# Altium footprint library ICs And Semiconductors SMD.PcbLib: 943 footprints (part 20 of 60)
Each footprint in its own frame and in the unit in brackets; x right, y up, seen from the top. Pads: shape width x height; smd on the part's side, far side on the other; paste and mask are expansions set on the pad; w line width, h text height; cw(c..) or ccw(c..) is an arc to the next point about the centre after c.
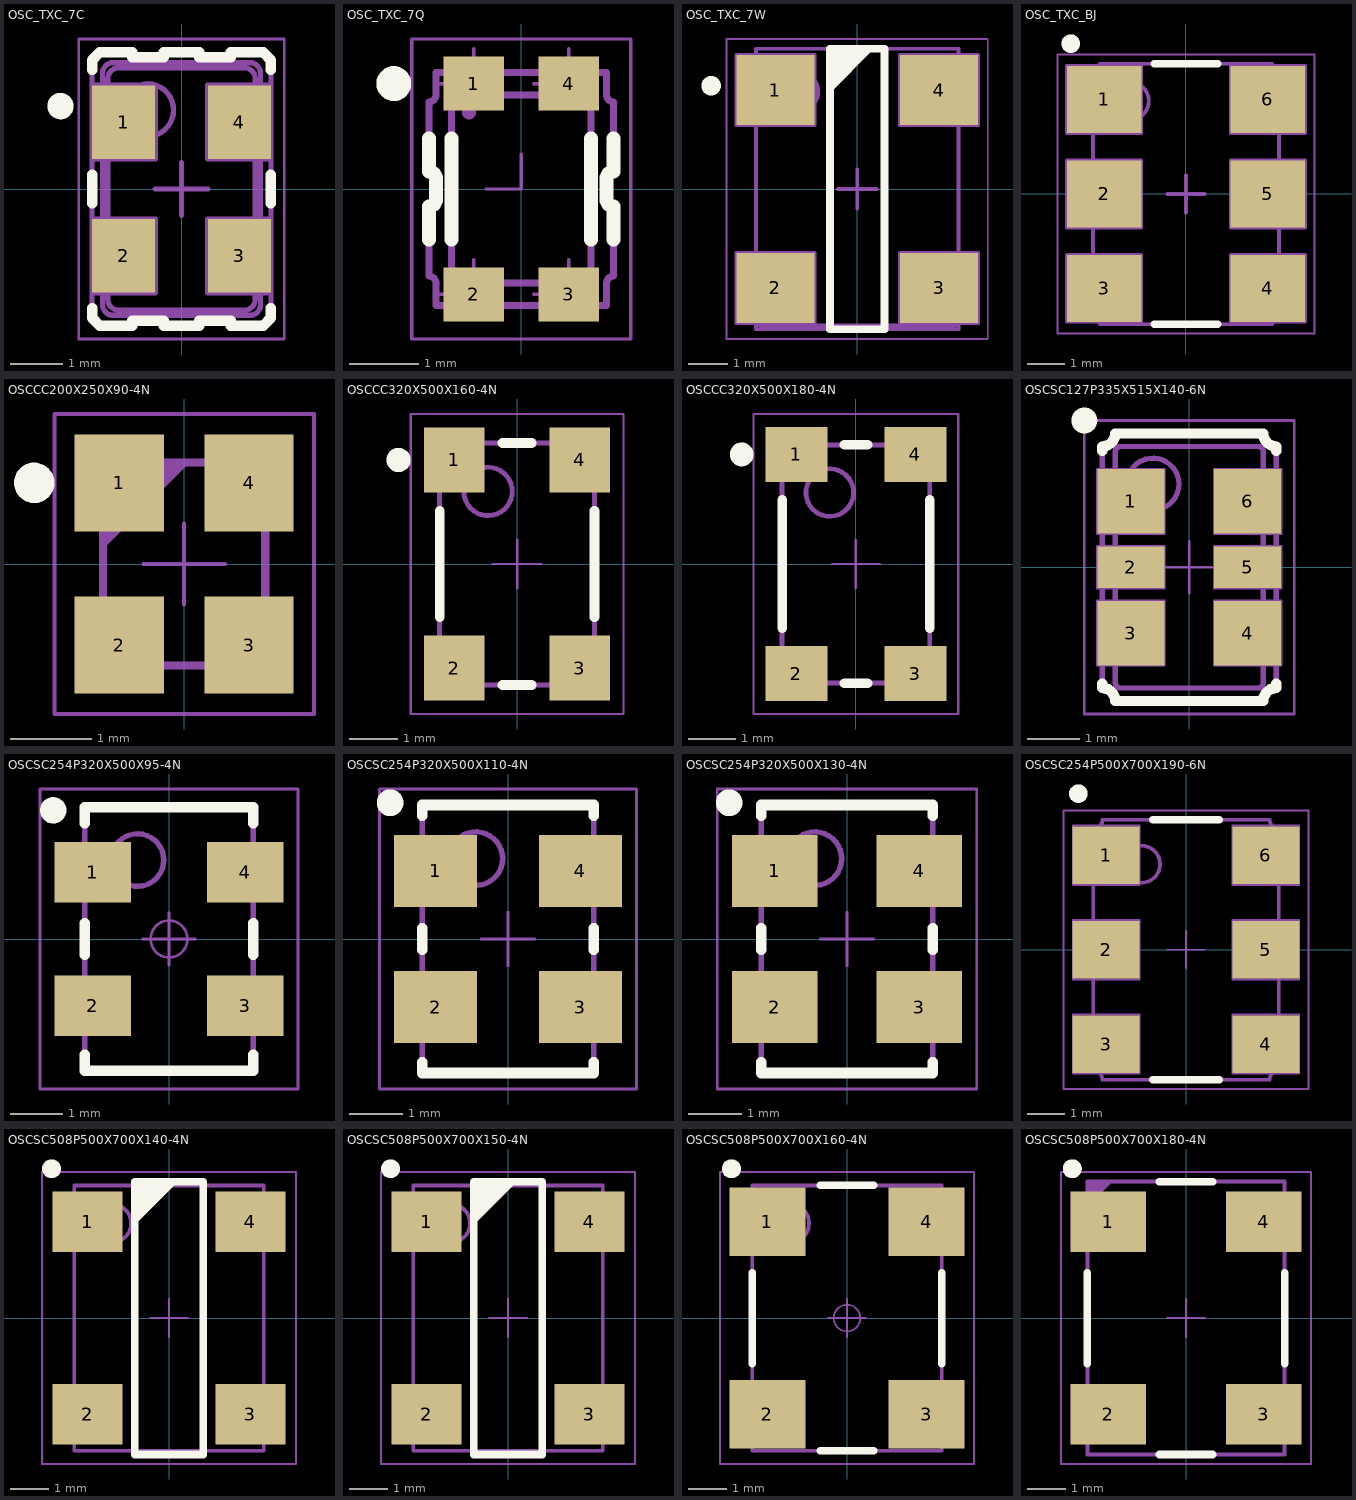
[diagram p19: the footprints below, top view; thin cyan lines are the x and y axes]

## OSC_TXC_7C [mm] "SMD Oscillator, 4 pins, 5 x 3.2mm, 7C Serie"
height 1.4
pads (4):
  rect 1.2x1.4 smd: 1(-1.1,1.27) 2(-1.1,-1.27) 3(1.1,-1.27) 4(1.1,1.27)
Top Overlay:
  circle w0.25: c-2.3,1.575 r0.125
  lines w0.2: -1.7,-2.27 -1.7,-2.45 -1.55,-2.6 -0.935,-2.6 -0.935,-2.5 -0.335,-2.5 -0.335,-2.6 ; -1.7,-0.27 -1.7,0.27 ; -1.7,2.27 -1.7,2.45 -1.55,2.6 -0.935,2.6 -0.935,2.5 -0.335,2.5 -0.335,2.6 0.335,2.6 0.335,2.5 0.935,2.5 0.935,2.6 1.55,2.6 1.7,2.45 1.7,2.27 ; 1.7,-2.27 1.7,-2.45 1.55,-2.6 0.935,-2.6 0.935,-2.5 0.335,-2.5 0.335,-2.6 ; 1.7,-0.27 1.7,0.27 ; -0.335,-2.6 0.335,-2.6 ; -0.335,-2.6 0.335,-2.6
Mechanical 8:
  lines w0.1: -1.6,-1.27 -1.1,-1.27 ; -1.6,1.27 -1.1,1.27 ; -1.1,-1.77 -1.1,-1.27 ; -1.1,-0.77 -1.1,-1.27 ; -1.1,0.77 -1.1,1.27 ; -1.1,1.77 -1.1,1.27 ; -0.6,-1.27 -1.1,-1.27 ; -0.6,1.27 -1.1,1.27 ; -0.5,0 0,0 ; 0,-0.5 0,0 ; 0,0.5 0,0 ; 0.5,0 0,0 ; 0.6,-1.27 1.1,-1.27 ; 0.6,1.27 1.1,1.27 ; 1.1,-1.77 1.1,-1.27 ; 1.1,-0.77 1.1,-1.27 ; 1.1,0.77 1.1,1.27 ; 1.1,1.77 1.1,1.27 ; 1.6,-1.27 1.1,-1.27 ; 1.6,1.27 1.1,1.27 ; -1.7,-1.97 -0.5,-1.97 -0.5,-0.57 -1.7,-0.57 -1.7,-1.97 ; -1.7,0.57 -0.5,0.57 -0.5,1.97 -1.7,1.97 -1.7,0.57 ; 0.5,-1.97 0.5,-0.57 1.7,-0.57 1.7,-1.97 0.5,-1.97 ; 0.5,0.57 1.7,0.57 1.7,1.97 0.5,1.97 0.5,0.57
Mechanical 14:
  circle w0.1: c-0.65,1.5 r0.5
  lines w0.1: -0.335,-2.6 0.335,-2.6 ; -0.335,-2.6 -0.335,-2.5 -0.935,-2.5 -0.935,-2.6 -1.55,-2.6 -1.7,-2.45 -1.7,-1.97 -1.6,-1.87 -1.6,-0.67 -1.7,-0.57 -1.7,0.57 -1.6,0.67 -1.6,1.87 -1.7,1.97 -1.7,2.45 -1.55,2.6 -0.935,2.6 -0.935,2.5 -0.335,2.5 -0.335,2.6 0.335,2.6 0.335,2.5 0.935,2.5 0.935,2.6 1.55,2.6 1.7,2.45 1.7,1.97 1.6,1.87 1.6,0.67 1.7,0.57 1.7,-0.57 1.6,-0.67 1.6,-1.87 1.7,-1.97 1.7,-2.45 1.55,-2.6 0.935,-2.6 0.935,-2.5 0.335,-2.5 0.335,-2.6 ; -0.335,-2.6 0.335,-2.6 ; -1.5,-2.2 ccw(c-1.3,-2.2) -1.3,-2.4 1.3,-2.4 ccw(c1.3,-2.2) 1.5,-2.2 1.5,2.2 ccw(c1.3,2.2) 1.3,2.4 -1.3,2.4 ccw(c-1.3,2.2) -1.5,2.2 -1.5,-2.2 ; -1.4,-2.1 ccw(c-1.2,-2.1) -1.2,-2.3 1.2,-2.3 ccw(c1.2,-2.1) 1.4,-2.1 1.4,2.1 ccw(c1.2,2.1) 1.2,2.3 -1.2,2.3 ccw(c-1.2,2.1) -1.4,2.1 -1.4,-2.1
Mechanical 15:
  lines w0.05: -1.95,-2.85 1.95,-2.85 1.95,2.85 -1.95,2.85 -1.95,-2.85
3D body "OSC_TXC_7C.stp": height 1.4, standoff 0, extent -1.7,-2.6 1.7,2.6

## OSC_TXC_7Q [mm] "SMD Oscillator, 4 pins, 3.2 x 2.5mm, 7Q Series"
height 1.1
pads (4):
  rect 0.87x0.78 smd: 1(-0.68,1.515) 2(-0.68,-1.515) 3(0.68,-1.515) 4(0.68,1.515)
Top Overlay:
  circle w0.25: c-1.83,1.515 r0.125
  lines w0.2: -1.325,-0.725 -1.325,-0.25 ccw(c-1.325,-0.15) -1.225,-0.15 -1.225,0.15 ccw(c-1.325,0.15) -1.325,0.25 -1.325,0.725 ; -1,-0.725 -1,0.725 ; 1,-0.725 1,0.725 ; 1.325,-0.725 1.325,-0.25 cw(c1.325,-0.15) 1.225,-0.15 1.225,0.15 cw(c1.325,0.15) 1.325,0.25 1.325,0.725
Mechanical 8:
  lines w0.05: -1.18,-1.515 -0.68,-1.515 -0.68,-1.015 ; -1.18,1.515 -0.68,1.515 -0.68,2.015 ; -0.5,0 0,0 0,0.5 ; 0.18,-1.515 0.68,-1.515 0.68,-1.015 ; 0.18,1.515 0.68,1.515 0.68,2.015
Mechanical 14:
  circle w0.1: c-0.75,1.1 r0.05
  lines w0.1: -1.325,-1.25 cw(c-1.325,-1.35) -1.225,-1.35 -1.225,-1.675 -0.77,-1.675 cw(c-0.67,-1.675) -0.67,-1.575 -0.6,-1.575 cw(c-0.6,-1.675) -0.5,-1.675 0.5,-1.675 cw(c0.6,-1.675) 0.6,-1.575 0.67,-1.575 cw(c0.67,-1.675) 0.77,-1.675 1.225,-1.675 1.225,-1.35 cw(c1.325,-1.35) 1.325,-1.25 1.325,-0.25 cw(c1.325,-0.15) 1.225,-0.15 1.225,0.15 cw(c1.325,0.15) 1.325,0.25 1.325,1.25 cw(c1.325,1.35) 1.225,1.35 1.225,1.675 0.77,1.675 cw(c0.67,1.675) 0.67,1.575 0.6,1.575 cw(c0.6,1.675) 0.5,1.675 -0.5,1.675 cw(c-0.6,1.675) -0.6,1.575 -0.67,1.575 cw(c-0.67,1.675) -0.77,1.675 -1.225,1.675 -1.225,1.35 cw(c-1.325,1.35) -1.325,1.25 -1.325,0.25 cw(c-1.325,0.15) -1.225,0.15 -1.225,-0.15 cw(c-1.325,-0.15) -1.325,-0.25 -1.325,-1.25 ; -1,-1.1 ccw(c-0.75,-1.1) -0.75,-1.35 0.75,-1.35 ccw(c0.75,-1.1) 1,-1.1 1,1.1 ccw(c0.75,1.1) 0.75,1.35 -0.75,1.35 ccw(c-0.75,1.1) -1,1.1 -1,-1.1
Mechanical 15:
  lines w0.05: -1.575,-2.155 1.575,-2.155 1.575,2.155 -1.575,2.155 -1.575,-2.155
3D body "OSC_TXC_7Q.stp": height 1.1, standoff 0, extent -1.325,-1.675 1.325,1.675

## OSC_TXC_7W [mm] "SMD Oscillator, Side Convave, 4 pins, 5.00x7.00mm 7W Series"
height 1.5
pads (4):
  rect 2x1.8 smd: 1(-2.1,2.54) 2(-2.1,-2.54) 3(2.1,-2.54) 4(2.1,2.54)
Top Overlay:
  circle w0.25: c-3.75,2.65 r0.125
  lines w0.2: -0.7,2.6 0.3,3.6 ; -0.7,2.8 0.1,3.6 ; -0.7,3 -0.1,3.6 ; -0.7,3.2 -0.3,3.6 ; -0.7,3.4 -0.5,3.6 ; -0.7,-3.6 0.7,-3.6 0.7,3.6 -0.7,3.6 -0.7,-3.6
Mechanical 8:
  lines w0.1: -2.6,-2.54 -2.1,-2.54 ; -2.6,2.54 -2.1,2.54 ; -2.1,-3.04 -2.1,-2.54 ; -2.1,-2.04 -2.1,-2.54 ; -2.1,2.04 -2.1,2.54 ; -2.1,3.04 -2.1,2.54 ; -1.6,-2.54 -2.1,-2.54 ; -1.6,2.54 -2.1,2.54 ; -0.5,0 0,0 ; 0,-0.5 0,0 ; 0,0.5 0,0 ; 0.5,0 0,0 ; 1.6,-2.54 2.1,-2.54 ; 1.6,2.54 2.1,2.54 ; 2.1,-3.04 2.1,-2.54 ; 2.1,-2.04 2.1,-2.54 ; 2.1,2.04 2.1,2.54 ; 2.1,3.04 2.1,2.54 ; 2.6,-2.54 2.1,-2.54 ; 2.6,2.54 2.1,2.54 ; -3.1,-3.44 -1.1,-3.44 -1.1,-1.64 -3.1,-1.64 -3.1,-3.44 ; -3.1,1.64 -1.1,1.64 -1.1,3.44 -3.1,3.44 -3.1,1.64 ; 1.1,-3.44 3.1,-3.44 3.1,-1.64 1.1,-1.64 1.1,-3.44 ; 1.1,1.64 3.1,1.64 3.1,3.44 1.1,3.44 1.1,1.64
Mechanical 14:
  circle w0.1: c-1.5,2.5 r0.5
  lines w0.1: -2.5,-3.5 2.5,-3.5 ; -2.6,-3.6 -2.6,3.6 2.6,3.6 2.6,-3.6 -2.6,-3.6
Mechanical 15:
  lines w0.05: -3.35,-3.85 3.35,-3.85 3.35,3.85 -3.35,3.85 -3.35,-3.85
3D body "OSC_TXC_7W.stp": height 1.42, standoff 0, extent -2.6,-3.6 2.6,3.6

## OSC_TXC_BJ [mm] "SMD Oscillator, Side Convave, 6 pins, 5.00x7.00mm BJ Series"
height 1.5
pads (6):
  rect 2x1.8 smd: 1(-2.2,2.54) 2(-2.2,0) 3(-2.2,-2.54) 4(2.2,-2.54) 5(2.2,0) 6(2.2,2.54)
Top Overlay:
  circle w0.25: c-3.1,4.04 r0.125
  lines w0.2: -0.85,-3.5 0.85,-3.5 ; -0.85,3.5 0.85,3.5
Mechanical 8:
  lines w0.1: -2.7,-2.54 -2.2,-2.54 ; -2.7,0 -2.2,0 ; -2.7,2.54 -2.2,2.54 ; -2.2,-3.04 -2.2,-2.54 ; -2.2,-2.04 -2.2,-2.54 ; -2.2,-0.5 -2.2,0 ; -2.2,0.5 -2.2,0 ; -2.2,2.04 -2.2,2.54 ; -2.2,3.04 -2.2,2.54 ; -1.7,-2.54 -2.2,-2.54 ; -1.7,0 -2.2,0 ; -1.7,2.54 -2.2,2.54 ; -0.5,0 0,0 ; 0,-0.5 0,0 ; 0,0.5 0,0 ; 0.5,0 0,0 ; 1.7,-2.54 2.2,-2.54 ; 1.7,0 2.2,0 ; 1.7,2.54 2.2,2.54 ; 2.2,-3.04 2.2,-2.54 ; 2.2,-2.04 2.2,-2.54 ; 2.2,-0.5 2.2,0 ; 2.2,0.5 2.2,0 ; 2.2,2.04 2.2,2.54 ; 2.2,3.04 2.2,2.54 ; 2.7,-2.54 2.2,-2.54 ; 2.7,0 2.2,0 ; 2.7,2.54 2.2,2.54 ; -3.2,-3.44 -1.2,-3.44 -1.2,-1.64 -3.2,-1.64 -3.2,-3.44 ; -3.2,-0.9 -1.2,-0.9 -1.2,0.9 -3.2,0.9 -3.2,-0.9 ; -3.2,1.64 -1.2,1.64 -1.2,3.44 -3.2,3.44 -3.2,1.64 ; 1.2,-3.44 3.2,-3.44 3.2,-1.64 1.2,-1.64 1.2,-3.44 ; 1.2,-0.9 3.2,-0.9 3.2,0.9 1.2,0.9 1.2,-0.9 ; 1.2,1.64 3.2,1.64 3.2,3.44 1.2,3.44 1.2,1.64
Mechanical 14:
  circle w0.1: c-1.5,2.5 r0.5
  lines w0.1: -2.5,-3.317 cw(c-2.6,-3.6) -2.317,-3.5 2.317,-3.5 cw(c2.6,-3.6) 2.5,-3.317 2.5,-3.04 cw(c2.499,-2.84) 2.299,-2.84 2.299,-2.24 cw(c2.499,-2.24) 2.5,-2.04 2.5,-0.5 cw(c2.499,-0.3) 2.299,-0.3 2.299,0.3 cw(c2.499,0.3) 2.5,0.5 2.5,2.04 cw(c2.499,2.24) 2.299,2.24 2.299,2.84 cw(c2.499,2.84) 2.5,3.04 2.5,3.317 cw(c2.6,3.6) 2.317,3.5 -2.317,3.5 cw(c-2.6,3.6) -2.5,3.317 -2.5,3.04 cw(c-2.499,2.84) -2.299,2.84 -2.299,2.24 cw(c-2.499,2.24) -2.5,2.04 -2.5,0.5 cw(c-2.499,0.3) -2.299,0.3 -2.299,-0.3 cw(c-2.499,-0.3) -2.5,-0.5 -2.5,-2.04 cw(c-2.499,-2.24) -2.299,-2.24 -2.299,-2.84 cw(c-2.499,-2.84) -2.5,-3.04 -2.5,-3.317
Mechanical 15:
  lines w0.05: -3.45,-3.75 3.45,-3.75 3.45,3.75 -3.45,3.75 -3.45,-3.75
3D body "OSC_TXC_BJ.stp": height 1.6, standoff 0, extent -2.5,-3.5 2.5,3.5

## OSCCC200X250X90-4N [mm] "Oscillator, corner concave; 4 pin, 2.50mm L X 2.00mm W X 0.90mm H, IPC Medium Density"
height 0.9
pads (4):
  rect 1.1x1.2 smd: 1(-0.8,1) 2(-0.8,-1) 3(0.8,-1) 4(0.8,1)
Top Overlay:
  circle w0.25: c-1.85,1 r0.125
Mechanical 14:
  lines w0.1: -1,0.25 0,1.25 ; -1,0.35 -0.1,1.25 ; -1,0.45 -0.2,1.25 ; -1,0.55 -0.3,1.25 ; -1,0.65 -0.4,1.25 ; -1,0.75 -0.5,1.25 ; -1,0.85 -0.6,1.25 ; -1,0.95 -0.7,1.25 ; -1,1.05 -0.8,1.25 ; -1,1.15 -0.9,1.25 ; -1,-1.25 -1,1.25 1,1.25 1,-1.25 -1,-1.25
Mechanical 15:
  lines w0.05: -0.5,0 0.5,0 ; 0,-0.5 0,0.5 ; -1.6,-1.85 -1.6,1.85 1.6,1.85 1.6,-1.85 -1.6,-1.85
3D body "OSCCC200X250X90-4N.stp": height 0.8, standoff 0, extent -1.075,-1.325 1.075,1.325

## OSCCC320X500X160-4N [mm] "SMD Oscillator, Corner Convave, 4 pins, 5x3.2mm"
height 1.6
pads (4):
  rect 1.25x1.35 smd: 1(-1.3,2.15) 2(-1.3,-2.15) 3(1.3,-2.15) 4(1.3,2.15)
Top Overlay:
  circle w0.25: c-2.45,2.15 r0.125
  lines w0.2: -1.6,-1.1 -1.6,1.1 ; -0.3,-2.5 0.3,-2.5 ; -0.3,2.5 0.3,2.5 ; 1.6,-1.1 1.6,1.1
Mechanical 14:
  circle w0.1: c-0.6,1.5 r0.5
  lines w0.1: -1.6,-2.5 -1.6,2.5 1.6,2.5 1.6,-2.5 -1.6,-2.5
Mechanical 15:
  lines w0.05: -0.5,0 0.5,0 ; 0,-0.5 0,0.5 ; -2.2,-3.1 -2.2,3.1 2.2,3.1 2.2,-3.1 -2.2,-3.1
3D body "OSCCC320X500X160-4N.stp": height 1.6, standoff 0, extent -1.675,-2.575 1.675,2.575

## OSCCC320X500X180-4N [mm] "SMD Oscillator, Corner Convave, 4 pins, 5x3mm"
height 1.8
pads (4):
  rect 1.3x1.15 smd: 1(-1.25,2.3) 2(-1.25,-2.3) 3(1.25,-2.3) 4(1.25,2.3)
Top Overlay:
  circle w0.25: c-2.4,2.3 r0.125
  lines w0.2: -1.55,-1.35 -1.55,1.35 ; -0.25,-2.5 0.25,-2.5 ; -0.25,2.5 0.25,2.5 ; 1.55,-1.35 1.55,1.35
Mechanical 14:
  circle w0.1: c-0.55,1.5 r0.5
  lines w0.1: -1.55,-2.5 1.55,-2.5 1.55,2.5 -1.55,2.5 -1.55,-2.5
Mechanical 15:
  lines w0.05: -0.5,0 0.5,0 ; 0,-0.5 0,0.5 ; -2.15,-3.15 2.15,-3.15 2.15,3.15 -2.15,3.15 -2.15,-3.15
3D body "OSCCC320X500X180-4N.stp": height 1.8, standoff 0, extent -1.7,-2.6 1.7,2.6

## OSCSC127P335X515X140-6N [mm] "Oscillator,side concave; 1.27mm pitch; 6 pin,3.35mm L X 5.15mm W X 1.40mm H, IPC Medium Density"
height 1.4
pads (6):
  rect 1.29x1.24 smd: 1(-1.125,1.27) 3(-1.125,-1.27) 4(1.125,-1.27) 6(1.125,1.27)
  rect 1.29x0.8 smd: 2(-1.125,0) 5(1.125,0)
Top Overlay:
  circle w0.25: c-2.02,2.825 r0.125
  lines w0.2: -1.675,-2.24 -1.675,-2.325 cw(c-1.675,-2.575) -1.425,-2.575 1.425,-2.575 cw(c1.675,-2.575) 1.675,-2.325 1.675,-2.24 ; -1.675,2.24 -1.675,2.325 ccw(c-1.675,2.575) -1.425,2.575 1.425,2.575 ccw(c1.675,2.575) 1.675,2.325 1.675,2.24
Mechanical 8:
  lines w0.05: -0.5,0 0,0 ; 0,-0.5 0,0 ; 0,0.5 0,0 ; 0.5,0 0,0 ; -1.77,-1.89 -1.77,-0.65 ; -1.77,-1.89 -0.48,-1.89 -0.48,-0.65 -1.77,-0.65 ; -1.77,-1.89 -1.125,-1.27 -1.77,-0.65 ; -1.77,-0.4 -0.48,-0.4 -0.48,0.4 -1.77,0.4 ; -1.77,-0.4 -1.77,0.4 ; -1.77,-0.4 -1.125,0 -1.77,0.4 ; -1.77,0.65 -1.77,1.89 ; -1.77,0.65 -0.48,0.65 -0.48,1.89 -1.77,1.89 ; -1.77,0.65 -1.125,1.27 -1.77,1.89 ; 1.77,-1.89 0.48,-1.89 0.48,-0.65 1.77,-0.65 ; 1.77,-1.89 1.77,-0.65 ; 1.77,-1.89 1.125,-1.27 1.77,-0.65 ; 1.77,-0.4 0.48,-0.4 0.48,0.4 1.77,0.4 ; 1.77,-0.4 1.77,0.4 ; 1.77,-0.4 1.125,0 1.77,0.4 ; 1.77,0.65 0.48,0.65 0.48,1.89 1.77,1.89 ; 1.77,0.65 1.77,1.89 ; 1.77,0.65 1.125,1.27 1.77,1.89
Mechanical 14:
  circle w0.1: c-0.7,1.6 r0.5
  lines w0.1: -1.675,-2.325 cw(c-1.675,-2.575) -1.425,-2.575 1.425,-2.575 cw(c1.675,-2.575) 1.675,-2.325 1.675,-1.52 cw(c1.675,-1.27) 1.575,-1.499 1.575,-1.041 cw(c1.675,-1.27) 1.675,-1.02 1.675,-0.25 cw(c1.675,0) 1.575,-0.229 1.575,0.229 cw(c1.675,0) 1.675,0.25 1.675,1.02 cw(c1.675,1.27) 1.575,1.041 1.575,1.499 cw(c1.675,1.27) 1.675,1.52 1.675,2.325 cw(c1.675,2.575) 1.425,2.575 -1.425,2.575 cw(c-1.675,2.575) -1.675,2.325 -1.675,1.52 cw(c-1.675,1.27) -1.575,1.499 -1.575,1.041 cw(c-1.675,1.27) -1.675,1.02 -1.675,0.25 cw(c-1.675,0) -1.575,0.229 -1.575,-0.229 cw(c-1.675,0) -1.675,-0.25 -1.675,-1.02 cw(c-1.675,-1.27) -1.575,-1.041 -1.575,-1.499 cw(c-1.675,-1.27) -1.675,-1.52 -1.675,-2.325 ; -1.425,-2.225 ccw(c-1.325,-2.225) -1.325,-2.325 1.325,-2.325 ccw(c1.325,-2.225) 1.425,-2.225 1.425,2.225 ccw(c1.325,2.225) 1.325,2.325 -1.325,2.325 ccw(c-1.325,2.225) -1.425,2.225 -1.425,-2.225
Mechanical 15:
  lines w0.05: -0.5,0 0.5,0 ; 0,-0.5 0,0.5 ; -2.02,-2.825 2.02,-2.825 2.02,2.825 -2.02,2.825 -2.02,-2.825
3D body "OSCSC127P335X515X140-6N.stp": height 1.4, standoff 0, extent -1.675,-2.575 1.675,2.575

## OSCSC254P320X500X95-4N [mm] "Oscillator, side concave; 2.54mm pitch; 4 pin, 3.20mm L X 5.00mm W X 1.10mm H, IPC Medium Density"
height 0.95
pads (4):
  rect 1.45x1.15 smd: 1(-1.45,1.27) 2(-1.45,-1.27) 3(1.45,-1.27) 4(1.45,1.27)
Top Overlay:
  circle w0.25: c-2.2,2.445 r0.125
  lines w0.2: -1.6,-2.2 -1.6,-2.5 1.6,-2.5 1.6,-2.2 ; -1.6,-0.3 -1.6,0.3 ; -1.6,2.2 -1.6,2.5 1.6,2.5 1.6,2.2 ; 1.6,-0.3 1.6,0.3
Mechanical 14:
  circle w0.1: c-0.6,1.5 r0.5
  lines w0.1: -1.6,-2.5 1.6,-2.5 1.6,2.5 -1.6,2.5 -1.6,-2.5
Mechanical 15:
  circle w0.05: c0,0 r0.35
  lines w0.05: -0.5,0 0.5,0 ; 0,-0.5 0,0.5 ; -2.45,-2.85 2.45,-2.85 2.45,2.85 -2.45,2.85 -2.45,-2.85
3D body "OSCSC254P320X500X110-4N.stp": height 1, standoff 0, extent -1.7,-2.6 1.7,2.6

## OSCSC254P320X500X110-4N [mm] "Oscillator, side concave; 2.54mm pitch; 4 pin, 3.20mm L X 5.00mm W X 1.10mm H, IPC Medium Density"
height 1.1
pads (4):
  rect 1.55x1.35 smd: 1(-1.35,1.27) 2(-1.35,-1.27) 3(1.35,-1.27) 4(1.35,1.27)
Top Overlay:
  circle w0.25: c-2.2,2.545 r0.125
  lines w0.2: -1.6,-2.3 -1.6,-2.5 1.6,-2.5 1.6,-2.3 ; -1.6,-0.2 -1.6,0.2 ; -1.6,2.3 -1.6,2.5 1.6,2.5 1.6,2.3 ; 1.6,-0.2 1.6,0.2
Mechanical 14:
  circle w0.1: c-0.6,1.5 r0.5
  lines w0.1: -1.6,-2.5 -1.6,2.5 1.6,2.5 1.6,-2.5 -1.6,-2.5
Mechanical 15:
  lines w0.05: -0.5,0 0.5,0 ; 0,-0.5 0,0.5 ; -2.4,-2.8 -2.4,2.8 2.4,2.8 2.4,-2.8 -2.4,-2.8
3D body "OSCSC254P320X500X110-4N.stp": height 1, standoff 0, extent -1.7,-2.6 1.7,2.6

## OSCSC254P320X500X130-4N [mm] "Oscillator, Side Concave; 2.54mm Pitch; 4 pin, 3.20mm L X 5.00mm W X 1.30mm H, IPC Medium Density"
height 1.3
pads (4):
  rect 1.6x1.35 smd: 1(-1.35,1.27) 2(-1.35,-1.27) 3(1.35,-1.27) 4(1.35,1.27)
Top Overlay:
  circle w0.25: c-2.2,2.545 r0.125
  lines w0.2: -1.6,-2.3 -1.6,-2.5 1.6,-2.5 1.6,-2.3 ; -1.6,-0.2 -1.6,0.2 ; -1.6,2.3 -1.6,2.5 1.6,2.5 1.6,2.3 ; 1.6,-0.2 1.6,0.2
Mechanical 14:
  circle w0.1: c-0.6,1.5 r0.5
  lines w0.1: -1.6,-2.5 1.6,-2.5 1.6,2.5 -1.6,2.5 -1.6,-2.5
Mechanical 15:
  lines w0.05: -0.5,0 0.5,0 ; 0,-0.5 0,0.5 ; -2.425,-2.8 2.425,-2.8 2.425,2.8 -2.425,2.8 -2.425,-2.8
3D body "OSCSC254P320X500X130-4N.stp": height 1.3, standoff 0, extent -1.7,-2.6 1.7,2.6

## OSCSC254P500X700X190-6N [mm] "Oscillator, side concave; 2.54mm pitch; 6 pin, 5.00mm L X 7.00mm W X 1.90mm H, IPC Medium Density"
height 1.9
pads (6):
  rect 1.8x1.55 smd: 1(-2.15,2.54) 2(-2.15,0) 3(-2.15,-2.54) 4(2.15,-2.54) 5(2.15,0) 6(2.15,2.54)
Top Overlay:
  circle w0.25: c-2.9,4.2 r0.125
  lines w0.2: -0.9,-3.5 0.9,-3.5 ; -0.9,3.5 0.9,3.5
Mechanical 8:
  lines w0.05: -2.65,-2.54 -2.15,-2.54 ; -2.65,0 -2.15,0 ; -2.65,2.54 -2.15,2.54 ; -2.15,-3.04 -2.15,-2.54 ; -2.15,-2.04 -2.15,-2.54 ; -2.15,-0.5 -2.15,0 ; -2.15,0.5 -2.15,0 ; -2.15,2.04 -2.15,2.54 ; -2.15,3.04 -2.15,2.54 ; -1.65,-2.54 -2.15,-2.54 ; -1.65,0 -2.15,0 ; -1.65,2.54 -2.15,2.54 ; -0.5,0 0,0 ; 0,-0.5 0,0 ; 0,0.5 0,0 ; 0.5,0 0,0 ; 1.65,-2.54 2.15,-2.54 ; 1.65,0 2.15,0 ; 1.65,2.54 2.15,2.54 ; 2.15,-3.04 2.15,-2.54 ; 2.15,-2.04 2.15,-2.54 ; 2.15,-0.5 2.15,0 ; 2.15,0.5 2.15,0 ; 2.15,2.04 2.15,2.54 ; 2.15,3.04 2.15,2.54 ; 2.65,-2.54 2.15,-2.54 ; 2.65,0 2.15,0 ; 2.65,2.54 2.15,2.54 ; -3.05,-3.34 -1.25,-3.34 -1.25,-1.74 -3.05,-1.74 -3.05,-3.34 ; -3.05,-0.8 -1.25,-0.8 -1.25,0.8 -3.05,0.8 -3.05,-0.8 ; -3.05,1.74 -1.25,1.74 -1.25,3.34 -3.05,3.34 -3.05,1.74 ; 1.25,-3.34 1.25,-1.74 3.05,-1.74 3.05,-3.34 1.25,-3.34 ; 1.25,-0.8 1.25,0.8 3.05,0.8 3.05,-0.8 1.25,-0.8 ; 1.25,1.74 1.25,3.34 3.05,3.34 3.05,1.74 1.25,1.74
Mechanical 14:
  circle w0.1: c-1.2,2.3 r0.5
  lines w0.1: -2.5,-3.25 cw(c-2.5,-3.5) -2.25,-3.5 2.25,-3.5 cw(c2.5,-3.5) 2.5,-3.25 2.5,-2.845 cw(c2.633,-2.54) 2.5,-2.235 2.5,-0.305 cw(c2.633,0) 2.5,0.305 2.5,2.235 cw(c2.633,2.54) 2.5,2.845 2.5,3.25 cw(c2.5,3.5) 2.25,3.5 -2.25,3.5 cw(c-2.5,3.5) -2.5,3.25 -2.5,2.845 cw(c-2.633,2.54) -2.5,2.235 -2.5,0.305 cw(c-2.633,0) -2.5,-0.305 -2.5,-2.235 cw(c-2.633,-2.54) -2.5,-2.845 -2.5,-3.25
Mechanical 15:
  lines w0.05: -3.3,-3.75 -3.3,3.75 3.3,3.75 3.3,-3.75 -3.3,-3.75
3D body "OSCSC254P500X700X190-6N.stp": height 2, standoff 0, extent -2.5,-3.5 2.5,3.5

## OSCSC508P500X700X140-4N [mm] "Oscillator,side concave; 5.08mm pitch; 4 pin,5.00mm L X 7.00mm W X 1.40mm H, IPC Medium Density"
height 1.4
pads (4):
  rect 1.85x1.6 smd: 1(-2.15,2.54) 2(-2.15,-2.54) 3(2.15,-2.54) 4(2.15,2.54)
Top Overlay:
  circle w0.25: c-3.1,3.94 r0.125
  lines w0.2: -0.9,2.6 0.1,3.6 ; -0.9,2.8 -0.1,3.6 ; -0.9,3 -0.3,3.6 ; -0.9,3.2 -0.5,3.6 ; -0.9,3.4 -0.7,3.6 ; -0.9,-3.6 -0.9,3.6 0.9,3.6 0.9,-3.6 -0.9,-3.6
Mechanical 14:
  circle w0.1: c-1.5,2.5 r0.5
  lines w0.1: -2.5,-3.5 -2.5,3.5 2.5,3.5 2.5,-3.5 -2.5,-3.5
Mechanical 15:
  lines w0.05: -0.5,0 0.5,0 ; 0,-0.5 0,0.5 ; -3.35,-3.85 -3.35,3.85 3.35,3.85 3.35,-3.85 -3.35,-3.85
3D body "OSCSC508P500X700X140-4N.stp": height 1.4, standoff 0, extent -2.6,-3.6 2.6,3.6

## OSCSC508P500X700X150-4N [mm] "CFPS-72-73 Case, SMD Oscillator, side convave, 4 pins, 5.00x7.00mm"
height 1.5
pads (4):
  rect 1.85x1.6 smd: 1(-2.15,2.54) 2(-2.15,-2.54) 3(2.15,-2.54) 4(2.15,2.54)
Top Overlay:
  circle w0.25: c-3.1,3.94 r0.125
  lines w0.2: -0.9,2.6 0.1,3.6 ; -0.9,2.8 -0.1,3.6 ; -0.9,3 -0.3,3.6 ; -0.9,3.2 -0.5,3.6 ; -0.9,3.4 -0.7,3.6 ; -0.9,-3.6 -0.9,3.6 0.9,3.6 0.9,-3.6 -0.9,-3.6
Mechanical 14:
  circle w0.1: c-1.5,2.5 r0.5
  lines w0.1: -2.5,-3.5 2.5,-3.5 2.5,3.5 -2.5,3.5 -2.5,-3.5
Mechanical 15:
  lines w0.05: -0.5,0 0.5,0 ; 0,-0.5 0,0.5 ; -3.35,-3.85 3.35,-3.85 3.35,3.85 -3.35,3.85 -3.35,-3.85
3D body "OSCSC508P500X700X150-4N.stp": height 1.5, standoff 0, extent -2.6,-3.6 2.6,3.6

## OSCSC508P500X700X160-4N [mm] "SMD Oscillator, side convave, 4 pins, 5.00x7.00mm"
height 1.6
pads (4):
  rect 2x1.8 smd: 1(-2.1,2.54) 2(-2.1,-2.54) 3(2.1,-2.54) 4(2.1,2.54)
Top Overlay:
  circle w0.25: c-3.05,3.94 r0.125
  lines w0.2: -2.5,-1.2 -2.5,1.2 ; -0.7,-3.5 0.7,-3.5 ; -0.7,3.5 0.7,3.5 ; 2.5,-1.2 2.5,1.2
Mechanical 14:
  circle w0.1: c-1.5,2.5 r0.5
  lines w0.1: -2.5,-3.5 -2.5,3.5 2.5,3.5 2.5,-3.5 -2.5,-3.5
Mechanical 15:
  circle w0.05: c0,0 r0.35
  lines w0.05: -0.5,0 0.5,0 ; 0,-0.5 0,0.5 ; -3.35,-3.85 -3.35,3.85 3.35,3.85 3.35,-3.85 -3.35,-3.85
3D body "OSCSC508P500X700X160-4N.stp": height 1.6, standoff 0, extent -2.6,-3.6 2.6,3.6

## OSCSC508P500X700X180-4N [mm] "SMD Oscillator, side convave, 4 pins, 5.00x7.00mm"
height 1.8
pads (4):
  rect 2x1.6 smd: 1(-2.05,2.54) 2(-2.05,-2.54) 3(2.05,-2.54) 4(2.05,2.54)
Top Overlay:
  circle w0.25: c-3,3.94 r0.125
  lines w0.2: -2.6,-1.2 -2.6,1.2 ; -0.7,-3.6 0.7,-3.6 ; -0.7,3.6 0.7,3.6 ; 2.6,-1.2 2.6,1.2
Mechanical 14:
  lines w0.1: -2.6,3 -2,3.6 ; -2.6,3.1 -2.1,3.6 ; -2.6,3.2 -2.2,3.6 ; -2.6,3.3 -2.3,3.6 ; -2.6,3.4 -2.4,3.6 ; -2.6,3.5 -2.5,3.6 ; -2.6,-3.6 2.6,-3.6 2.6,3.6 -2.6,3.6 -2.6,-3.6
Mechanical 15:
  lines w0.05: -0.5,0 0.5,0 ; 0,-0.5 0,0.5 ; -3.3,-3.85 -3.3,3.85 3.3,3.85 3.3,-3.85 -3.3,-3.85
3D body "OSCSC508P500X700X180-4N.stp": height 1.8, standoff 0, extent -2.6,-3.6 2.6,3.6